# Altium footprint library Footprint.PcbLib: 137 footprints (part 6 of 9)
Each footprint in its own frame and in the unit in brackets; x right, y up, seen from the top. Pads: shape width x height; smd on the part's side, far side on the other; paste and mask are expansions set on the pad; w line width, h text height; cw(c..) or ccw(c..) is an arc to the next point about the centre after c.
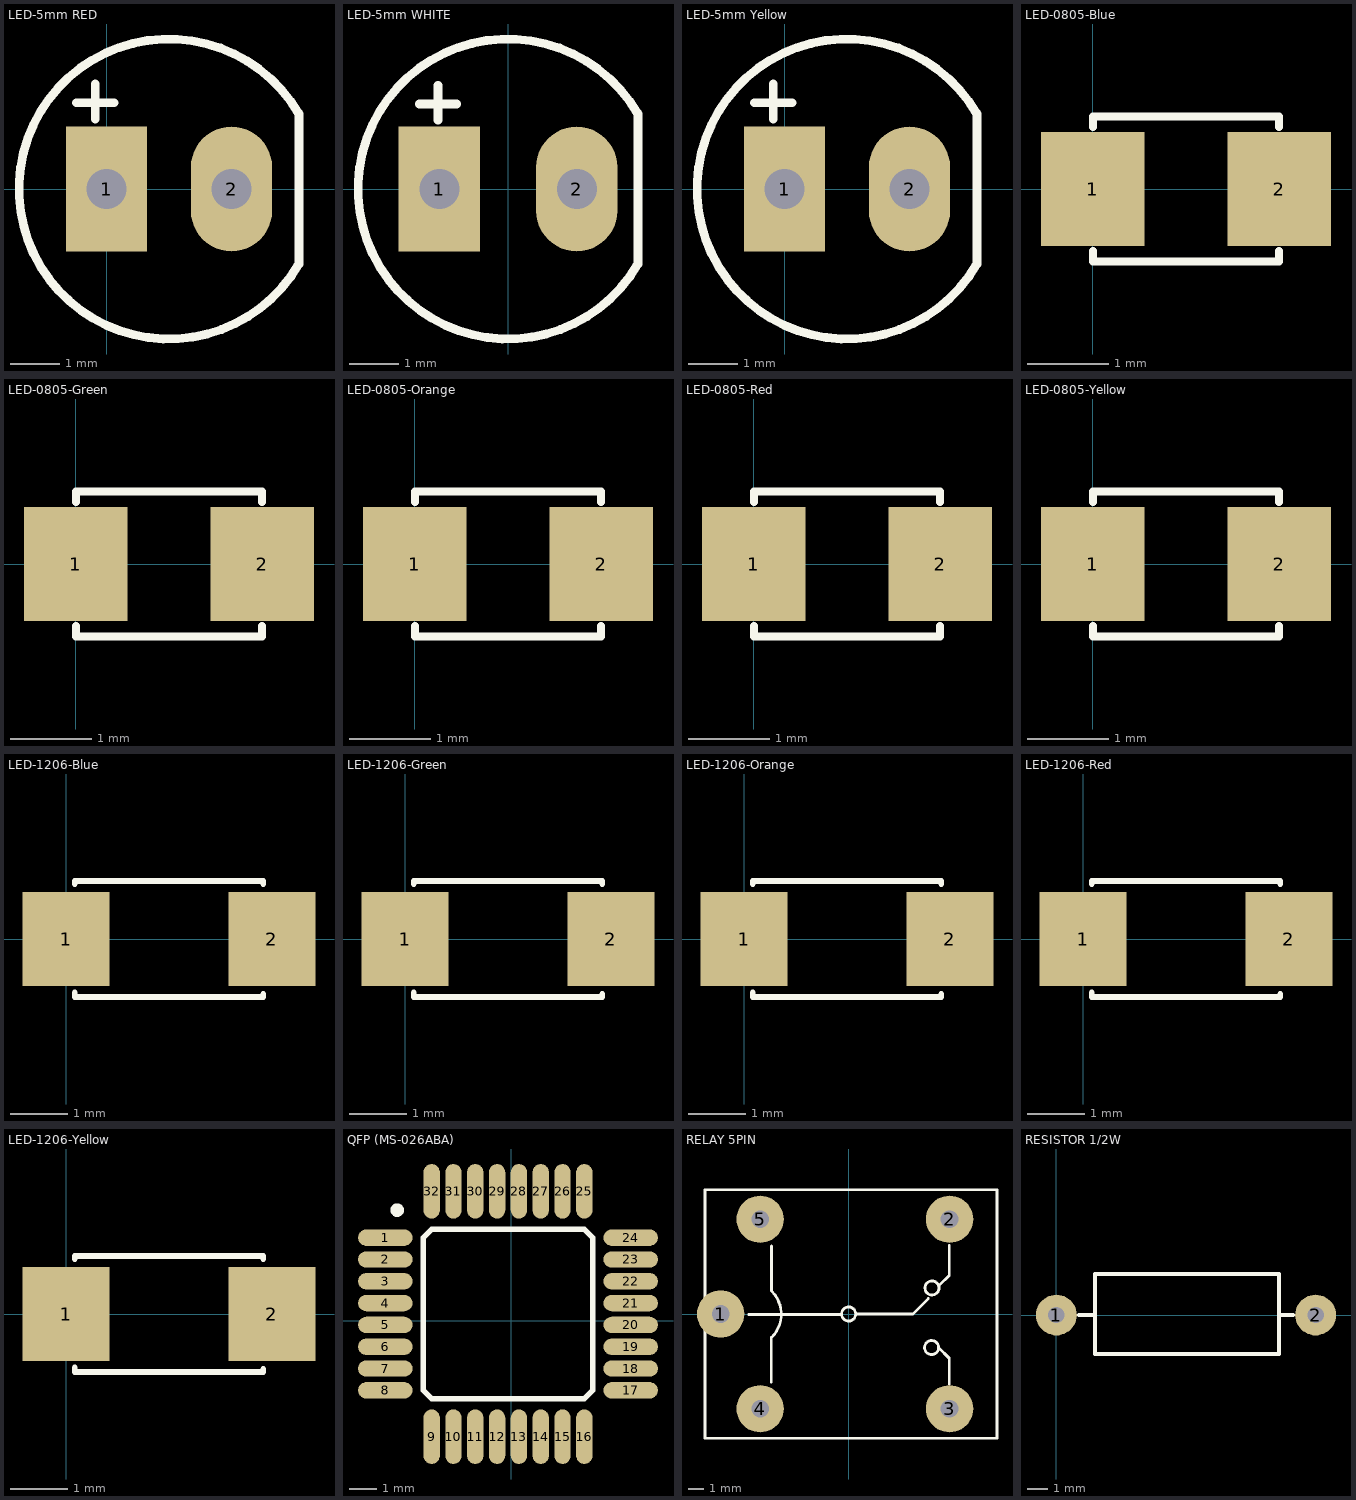
[diagram p5: the footprints below, top view; thin cyan lines are the x and y axes]

## LED-5mm RED [mil] "LED-5mm RED"
height 300
pads (2):
  rect 65x100 hole 32: 1(0,0)
  oval 65x100 hole 32: 2(100,0)
Top Overlay:
  lines w7: -24,69 6,69 ; -9,56 -9,84 ; 153.51,60.71 ccw(c50,0) 153.94,-59.97 ; 154,-59 154,60
3D body "SW3dPS-LEDd5R.STEP": height 339.18, standoff -243.49, extent -64.69,-119 148.69,117.99

## LED-5mm WHITE [mil] "LED-5mm WHITE"
height 300
pads (2):
  rect 65x100 hole 32: 1(-55,0)
  oval 65x100 hole 32: 2(55,0)
Top Overlay:
  lines w7: -71,68 -41,68 ; -56,55 -56,83 ; 103.51,60.71 ccw(c0,0) 103.94,-59.97 ; 104,-59 104,60
3D body "5 mm yellow led.step": height 340.05, standoff -767.12, extent -124,-125 120.88,120.26

## LED-5mm Yellow [mil] "LED-5mm Yellow"
height 300
pads (2):
  rect 65x100 hole 32: 1(0,0)
  oval 65x100 hole 32: 2(100,0)
Top Overlay:
  lines w7: -24,69 6,69 ; -9,56 -9,84 ; 153.51,60.71 ccw(c50,0) 153.94,-59.97 ; 154,-59 154,60
3D body "SW3dPS-LEDd5O.STEP": height 339.18, standoff -243.49, extent -66.69,-121.99 146.69,115

## LED-0805-Blue [mil] "LED-0805-Blue"
pads (2):
  rect 50x55 smd: 1(0,0) 2(90,0)
Top Overlay:
  lines w4: 0,-30 0,-35 90,-35 90,-30 ; 0,30 0,35 90,35 90,30
3D body "User Library-led_0805-blue.step": height 43.31, standoff 0, extent 5.24,-24.6 84.77,24.61

## LED-0805-Green [mil] "LED-0805-Green"
pads (2):
  rect 50x55 smd: 1(0,0) 2(90,0)
Top Overlay:
  lines w4: 0,-30 0,-35 90,-35 90,-30 ; 0,30 0,35 90,35 90,30
3D body "User Library-led_0805-Green.step": height 43.31, standoff 0, extent 5.24,-24.6 84.77,24.61

## LED-0805-Orange [mil] "LED-0805-Orange"
pads (2):
  rect 50x55 smd: 1(0,0) 2(90,0)
Top Overlay:
  lines w4: 0,-30 0,-35 90,-35 90,-30 ; 0,30 0,35 90,35 90,30
3D body "User Library-led_0805-orange.step": height 43.31, standoff 0, extent 5.24,-24.59 84.77,24.62

## LED-0805-Red [mil] "LED-0805-Red"
pads (2):
  rect 50x55 smd: 1(0,0) 2(90,0)
Top Overlay:
  lines w4: 0,-30 0,-35 90,-35 90,-30 ; 0,30 0,35 90,35 90,30
3D body "User Library-led_0805-red.step": height 43.31, standoff 0, extent 5.25,-24.6 84.77,24.62

## LED-0805-Yellow [mil] "LED-0805-Yellow"
pads (2):
  rect 50x55 smd: 1(0,0) 2(90,0)
Top Overlay:
  lines w4: 0,-30 0,-35 90,-35 90,-30 ; 0,30 0,35 90,35 90,30
3D body "User Library-led_0805-yellow.step": height 43.31, standoff 0, extent 5.25,-24.6 84.77,24.62

## LED-1206-Blue [mil] "LED-1206-Blue"
height 50
pads (2):
  rect 60x65 smd: 1(0,0) 2(142,0)
Top Overlay:
  lines w4: 6,-37 6,-40 136,-40 136,-38 ; 6,38 6,40 136,40 136,38
3D body "User Library-led_1206-blue.step": height 43.31, standoff 0, extent 6.62,-31.49 133.39,31.5

## LED-1206-Green [mil] "LED-1206-Green"
pads (2):
  rect 60x65 smd: 1(0,0) 2(142,0)
Top Overlay:
  lines w4: 6,-37 6,-40 136,-40 136,-38 ; 6,38 6,40 136,40 136,38
3D body "User Library-led_1206-green.step": height 43.31, standoff 0, extent 6.62,-31.49 133.39,31.5

## LED-1206-Orange [mil] "LED-1206-Orange"
pads (2):
  rect 60x65 smd: 1(0,0) 2(142,0)
Top Overlay:
  lines w4: 6,-37 6,-40 136,-40 136,-38 ; 6,38 6,40 136,40 136,38
3D body "User Library-led_1206-yellow.step": height 43.31, standoff 0, extent 6.62,-31.49 133.39,31.5

## LED-1206-Red [mil] "LED-1206-Red"
pads (2):
  rect 60x65 smd: 1(0,0) 2(142,0)
Top Overlay:
  lines w4: 6,-37 6,-40 136,-40 136,-38 ; 6,38 6,40 136,40 136,38
3D body "User Library-led_1206-red.step": height 43.31, standoff 0, extent 6.62,-31.49 133.39,31.5

## LED-1206-Yellow [mil] "LED-1206-Yellow"
pads (2):
  rect 60x65 smd: 1(0,0) 2(142,0)
Top Overlay:
  lines w4: 6,-37 6,-40 136,-40 136,-38 ; 6,38 6,40 136,40 136,38
3D body "User Library-led_1206-yellow.step": height 43.31, standoff 0, extent 6.62,-31.49 133.39,31.5

## QFP (MS-026ABA) [mm] "QFP MS-026 32PINS"
pads (32):
  oval 2x0.6 smd: 1(-4.627,3.054) 2(-4.627,2.254) 3(-4.627,1.454) 4(-4.627,0.654) 5(-4.627,-0.146) 6(-4.627,-0.946) 7(-4.627,-1.746) 8(-4.627,-2.546) 17(4.373,-2.546) 18(4.373,-1.746) 19(4.373,-0.946) 20(4.373,-0.146) 21(4.373,0.654) 22(4.373,1.454) 23(4.373,2.254) 24(4.373,3.054)
  oval 0.6x2 smd: 9(-2.927,-4.246) 10(-2.127,-4.246) 11(-1.327,-4.246) 12(-0.527,-4.246) 13(0.273,-4.246) 14(1.073,-4.246) 15(1.873,-4.246) 16(2.673,-4.246) 25(2.673,4.754) 26(1.873,4.754) 27(1.073,4.754) 28(0.273,4.754) 29(-0.527,4.754) 30(-1.327,4.754) 31(-2.127,4.754) 32(-2.927,4.754)
Top Overlay:
  circle w0.25: c-4.191,4.064 r0.125
  lines w0.2: -3.227,-2.546 -2.927,-2.846 2.673,-2.846 2.973,-2.546 2.973,3.054 2.673,3.354 -2.927,3.354 -3.227,3.054 -3.227,-2.546
3D body "User Library-QFP (MS-026).step": height 1.1, standoff 0, extent -4.631,-4.25 4.377,4.758

## RELAY 5PIN [mil] "RELAY 5PIN 480MIL"
pads (5):
  round 120 hole 45: 1(-325,0) 2(255,240) 3(255,-240) 4(-225,-240) 5(-225,240)
Top Overlay:
  circle w7: c209.2,-85 r17.8
  circle w7: c210.2,66 r17.8
  circle w7: c-0.8,0 r17.8
  lines w7: -254,-1 -21,-1 ; -197,-173 -197,-60 ; -196,-59 ccw(c-253.5,-0.5) -195,57 ; -196,58 -196,172 ; 19,0 162,0 201,39 ; 227,-85 254,-112 254,-178 ; 228,72 254,98 254,174 ; -365,-315 -365,315 375,315 375,-315 -365,-315
3D body "User Library-RELAY  12MMx12MM SQUARE-1.step": height 590.55, standoff -78.74, extent -423.7,-315 363.7,314.92

## RESISTOR 1/2W [mm] "P=0.5W, PITCH= 12.7mm"
pads (2):
  round 2 hole 0.8: 1(0,0) 2(12.7,0)
Top Overlay:
  lines w0.2: 1.1,0 1.9,0 ; 10.9,0 11.6,0 ; 1.9,-1.9 10.9,-1.9 10.9,2 1.9,2 1.9,-1.9
3D body "R 0.5W bt.STEP": height 4.38, standoff -5, extent -0.375,-1.825 13.075,1.925